# Altium footprint library CONN_HDR_MINI_ST_SMD.PcbLib: 102 footprints (part 3 of 7)
Each footprint in its own frame and in the unit in brackets; x right, y up, seen from the top. Pads: shape width x height; smd on the part's side, far side on the other; paste and mask are expansions set on the pad; w line width, h text height; cw(c..) or ccw(c..) is an arc to the next point about the centre after c.
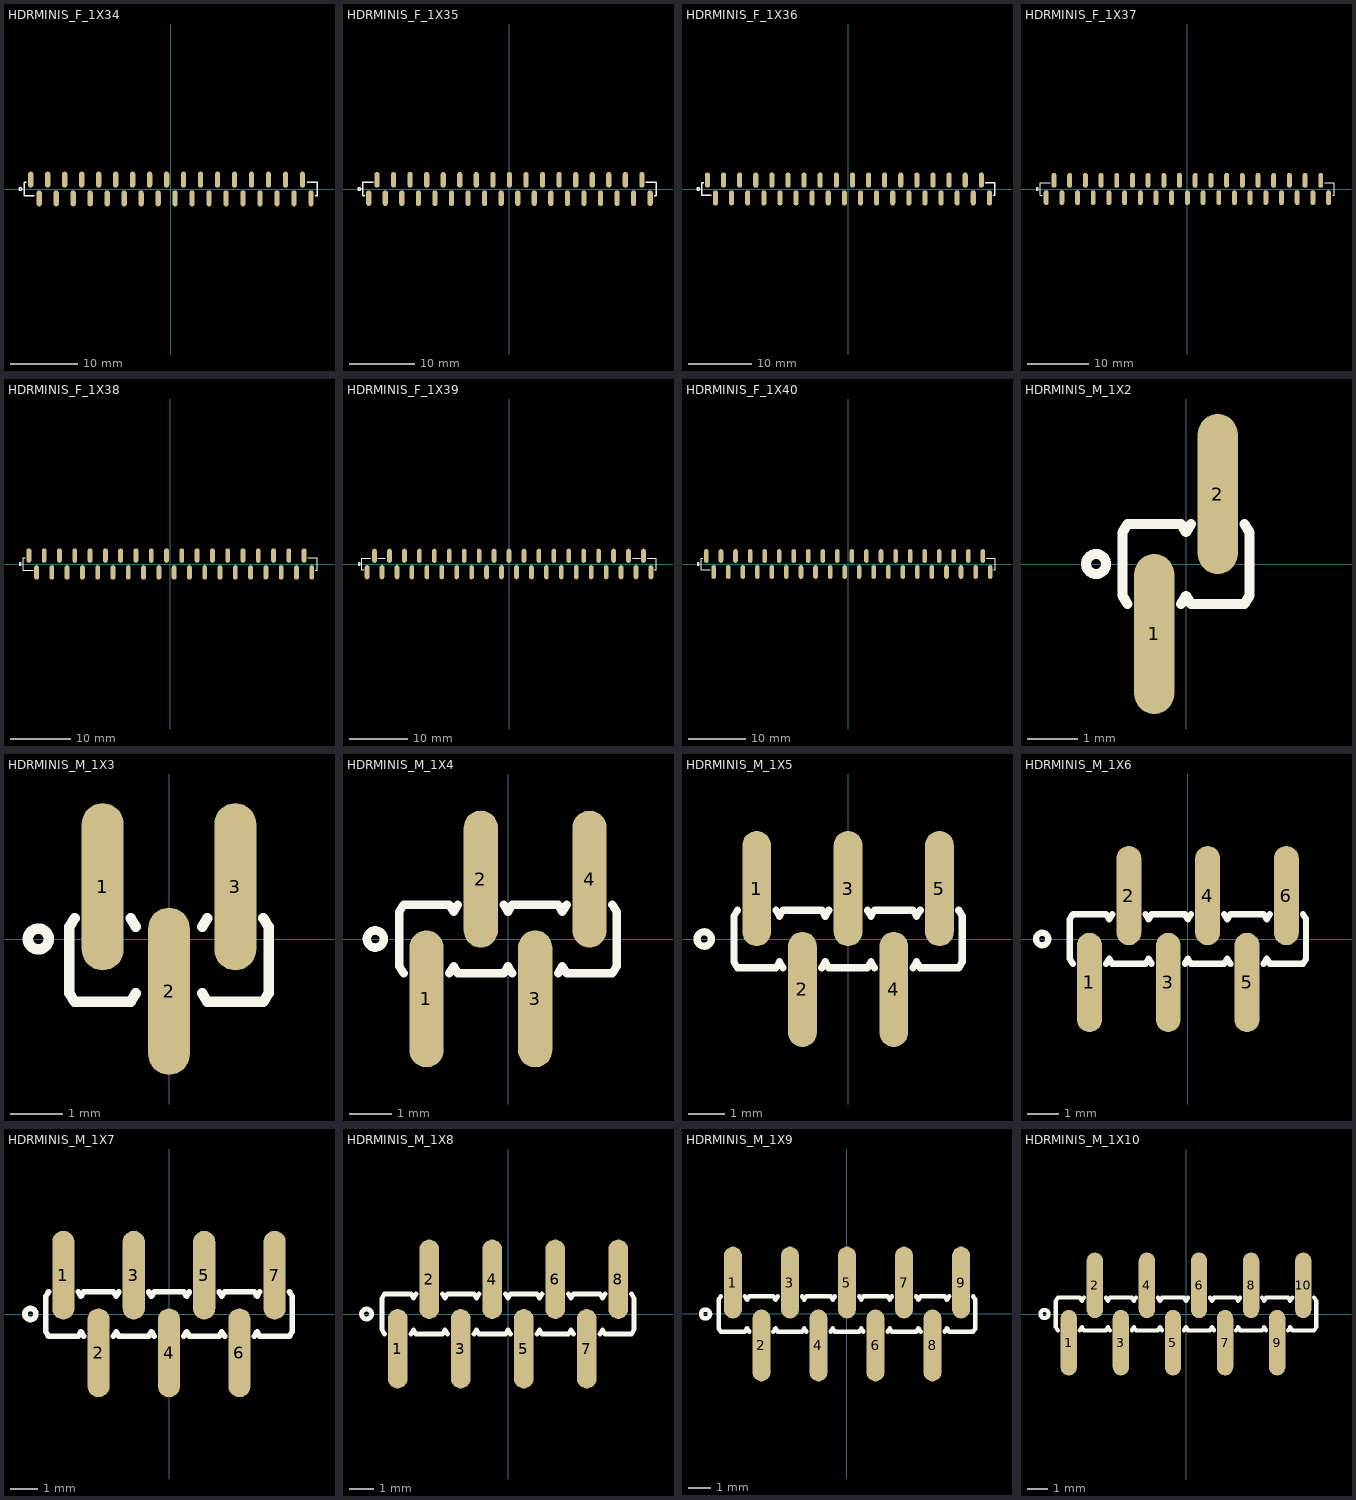
[diagram p2: the footprints below, top view; thin cyan lines are the x and y axes]

## HDRMINIS_F_1X34 [mm] "mini header (50mil pitch)"
pads (34):
  oval 0.8x2.4 smd mask+0.1: 1(-20.955,1.4) 2(-19.685,-1.4) 3(-18.415,1.4) 4(-17.145,-1.4) 5(-15.875,1.4) 6(-14.605,-1.4) 7(-13.335,1.4) 8(-12.065,-1.4) 9(-10.795,1.4) 10(-9.525,-1.4) 11(-8.255,1.4) 12(-6.985,-1.4) 13(-5.715,1.4) 14(-4.445,-1.4) 15(-3.175,1.4) 16(-1.905,-1.4) 17(-0.635,1.4) 18(0.635,-1.4) 19(1.905,1.4) 20(3.175,-1.4) 21(4.445,1.4) 22(5.715,-1.4) 23(6.985,1.4) 24(8.255,-1.4) 25(9.525,1.4) 26(10.795,-1.4) 27(12.065,1.4) 28(13.335,-1.4) 29(14.605,1.4) 30(15.875,-1.4) 31(17.145,1.4) 32(18.415,-1.4) 33(19.685,1.4) 34(20.955,-1.4)
Top Overlay:
  circle w0.2: c-22.5,0 r0.2
  lines w0.2: -21.6,1 -21.9,1 -21.9,-1 -20.4,-1 ; 20.4,1 21.9,1 21.9,-1 21.6,-1
3D body "a-bl127-eg-z02mr1.step": height 4.65, standoff 0.05, extent 3.61,-1.6 6.55,1.6
3D body "a-bl127-eg-z02mr1.step": height 4.65, standoff 0.05, extent 6.15,-1.6 9.09,1.6
3D body "a-bl127-eg-z02mr1.step": height 4.65, standoff 0.05, extent 8.69,-1.6 11.63,1.6
3D body "a-bl127-eg-z02mr1.step": height 4.65, standoff 0.05, extent 11.23,-1.6 14.17,1.6
3D body "a-bl127-eg-z02mr1.step": height 4.65, standoff 0.05, extent 13.77,-1.6 16.71,1.6
3D body "a-bl127-eg-z02mr1.step": height 4.65, standoff 0.05, extent 16.31,-1.6 19.25,1.6
3D body "a-bl127-eg-z02mr1.step": height 4.65, standoff 0.05, extent 18.85,-1.6 21.79,1.6
3D body "a-bl127-eg-z02mr1.step": height 4.65, standoff 0.05, extent -6.55,-1.6 -3.61,1.6
3D body "a-bl127-eg-z02mr1.step": height 4.65, standoff 0.05, extent -4.01,-1.6 -1.07,1.6
3D body "a-bl127-eg-z02mr1.step": height 4.65, standoff 0.05, extent -1.47,-1.6 1.47,1.6
3D body "a-bl127-eg-z02mr1.step": height 4.65, standoff 0.05, extent 1.07,-1.6 4.01,1.6
3D body "a-bl127-eg-z02mr1.step": height 4.65, standoff 0.05, extent -9.09,-1.6 -6.15,1.6
3D body "a-bl127-eg-z02mr1.step": height 4.65, standoff 0.05, extent -11.63,-1.6 -8.69,1.6
3D body "a-bl127-eg-z02mr1.step": height 4.65, standoff 0.05, extent -14.17,-1.6 -11.23,1.6
3D body "a-bl127-eg-z02mr1.step": height 4.65, standoff 0.05, extent -16.71,-1.6 -13.77,1.6
3D body "a-bl127-eg-z02mr1.step": height 4.65, standoff 0.05, extent -19.25,-1.6 -16.31,1.6
3D body "a-bl127-eg-z02mr1.step": height 4.65, standoff 0.05, extent -21.79,-1.6 -18.85,1.6

## HDRMINIS_F_1X35 [mm] "mini header (50mil pitch)"
pads (35):
  oval 0.8x2.4 smd mask+0.1: 1(-21.59,-1.4) 2(-20.32,1.4) 3(-19.05,-1.4) 4(-17.78,1.4) 5(-16.51,-1.4) 6(-15.24,1.4) 7(-13.97,-1.4) 8(-12.7,1.4) 9(-11.43,-1.4) 10(-10.16,1.4) 11(-8.89,-1.4) 12(-7.62,1.4) 13(-6.35,-1.4) 14(-5.08,1.4) 15(-3.81,-1.4) 16(-2.54,1.4) 17(-1.27,-1.4) 18(0,1.4) 19(1.27,-1.4) 20(2.54,1.4) 21(3.81,-1.4) 22(5.08,1.4) 23(6.35,-1.4) 24(7.62,1.4) 25(8.89,-1.4) 26(10.16,1.4) 27(11.43,-1.4) 28(12.7,1.4) 29(13.97,-1.4) 30(15.24,1.4) 31(16.51,-1.4) 32(17.78,1.4) 33(19.05,-1.4) 34(20.32,1.4) 35(21.59,-1.4)
Top Overlay:
  circle w0.2: c-23.033,0 r0.2
  lines w0.2: -22.2,-1 -22.5,-1 -22.5,1 -20.9,1 ; 20.9,1 22.5,1 22.5,-1 22.2,-1
3D body "a-bl127-eg-z03mr1.stp": height 4.65, standoff 0.05, extent -22.425,-1.6 -18.215,1.6
3D body "a-bl127-eg-z02mr1.step": height 4.65, standoff 0.05, extent -18.615,-1.6 -15.675,1.6
3D body "a-bl127-eg-z02mr1.step": height 4.65, standoff 0.05, extent -16.075,-1.6 -13.135,1.6
3D body "a-bl127-eg-z02mr1.step": height 4.65, standoff 0.05, extent -13.535,-1.6 -10.595,1.6
3D body "a-bl127-eg-z02mr1.step": height 4.65, standoff 0.05, extent -10.995,-1.6 -8.055,1.6
3D body "a-bl127-eg-z02mr1.step": height 4.65, standoff 0.05, extent -8.455,-1.6 -5.515,1.6
3D body "a-bl127-eg-z02mr1.step": height 4.65, standoff 0.05, extent -5.915,-1.6 -2.975,1.6
3D body "a-bl127-eg-z02mr1.step": height 4.65, standoff 0.05, extent 4.245,-1.6 7.185,1.6
3D body "a-bl127-eg-z02mr1.step": height 4.65, standoff 0.05, extent 1.705,-1.6 4.645,1.6
3D body "a-bl127-eg-z02mr1.step": height 4.65, standoff 0.05, extent -0.835,-1.6 2.105,1.6
3D body "a-bl127-eg-z02mr1.step": height 4.65, standoff 0.05, extent -3.375,-1.6 -0.435,1.6
3D body "a-bl127-eg-z02mr1.step": height 4.65, standoff 0.05, extent 19.485,-1.6 22.425,1.6
3D body "a-bl127-eg-z02mr1.step": height 4.65, standoff 0.05, extent 16.945,-1.6 19.885,1.6
3D body "a-bl127-eg-z02mr1.step": height 4.65, standoff 0.05, extent 14.405,-1.6 17.345,1.6
3D body "a-bl127-eg-z02mr1.step": height 4.65, standoff 0.05, extent 11.865,-1.6 14.805,1.6
3D body "a-bl127-eg-z02mr1.step": height 4.65, standoff 0.05, extent 9.325,-1.6 12.265,1.6
3D body "a-bl127-eg-z02mr1.step": height 4.65, standoff 0.05, extent 6.785,-1.6 9.725,1.6

## HDRMINIS_F_1X36 [mm] "mini header (50mil pitch)"
pads (36):
  oval 0.8x2.4 smd mask+0.1: 1(-22.225,1.4) 2(-20.955,-1.4) 3(-19.685,1.4) 4(-18.415,-1.4) 5(-17.145,1.4) 6(-15.875,-1.4) 7(-14.605,1.4) 8(-13.335,-1.4) 9(-12.065,1.4) 10(-10.795,-1.4) 11(-9.525,1.4) 12(-8.255,-1.4) 13(-6.985,1.4) 14(-5.715,-1.4) 15(-4.445,1.4) 16(-3.175,-1.4) 17(-1.905,1.4) 18(-0.635,-1.4) 19(0.635,1.4) 20(1.905,-1.4) 21(3.175,1.4) 22(4.445,-1.4) 23(5.715,1.4) 24(6.985,-1.4) 25(8.255,1.4) 26(9.525,-1.4) 27(10.795,1.4) 28(12.065,-1.4) 29(13.335,1.4) 30(14.605,-1.4) 31(15.875,1.4) 32(17.145,-1.4) 33(18.415,1.4) 34(19.685,-1.4) 35(20.955,1.4) 36(22.225,-1.4)
Top Overlay:
  circle w0.2: c-23.668,0 r0.2
  lines w0.2: -22.8,1 -23.1,1 -23.1,-1 -21.6,-1 ; 21.6,1 23.1,1 23.1,-1 22.8,-1
3D body "a-bl127-eg-z02mr1.step": height 4.65, standoff 0.05, extent -23.06,-1.6 -20.12,1.6
3D body "a-bl127-eg-z02mr1.step": height 4.65, standoff 0.05, extent -20.52,-1.6 -17.58,1.6
3D body "a-bl127-eg-z02mr1.step": height 4.65, standoff 0.05, extent -17.98,-1.6 -15.04,1.6
3D body "a-bl127-eg-z02mr1.step": height 4.65, standoff 0.05, extent -15.44,-1.6 -12.5,1.6
3D body "a-bl127-eg-z02mr1.step": height 4.65, standoff 0.05, extent -12.9,-1.6 -9.96,1.6
3D body "a-bl127-eg-z02mr1.step": height 4.65, standoff 0.05, extent -10.36,-1.6 -7.42,1.6
3D body "a-bl127-eg-z02mr1.step": height 4.65, standoff 0.05, extent -0.2,-1.6 2.74,1.6
3D body "a-bl127-eg-z02mr1.step": height 4.65, standoff 0.05, extent -2.74,-1.6 0.2,1.6
3D body "a-bl127-eg-z02mr1.step": height 4.65, standoff 0.05, extent -5.28,-1.6 -2.34,1.6
3D body "a-bl127-eg-z02mr1.step": height 4.65, standoff 0.05, extent -7.82,-1.6 -4.88,1.6
3D body "a-bl127-eg-z02mr1.step": height 4.65, standoff 0.05, extent 17.58,-1.6 20.52,1.6
3D body "a-bl127-eg-z02mr1.step": height 4.65, standoff 0.05, extent 20.12,-1.6 23.06,1.6
3D body "a-bl127-eg-z02mr1.step": height 4.65, standoff 0.05, extent 15.04,-1.6 17.98,1.6
3D body "a-bl127-eg-z02mr1.step": height 4.65, standoff 0.05, extent 12.5,-1.6 15.44,1.6
3D body "a-bl127-eg-z02mr1.step": height 4.65, standoff 0.05, extent 9.96,-1.6 12.9,1.6
3D body "a-bl127-eg-z02mr1.step": height 4.65, standoff 0.05, extent 7.42,-1.6 10.36,1.6
3D body "a-bl127-eg-z02mr1.step": height 4.65, standoff 0.05, extent 4.88,-1.6 7.82,1.6
3D body "a-bl127-eg-z02mr1.step": height 4.65, standoff 0.05, extent 2.34,-1.6 5.28,1.6

## HDRMINIS_F_1X37 [mm] "mini header (50mil pitch)"
pads (37):
  oval 0.8x2.4 smd mask+0.1: 1(-22.86,-1.4) 2(-21.59,1.4) 3(-20.32,-1.4) 4(-19.05,1.4) 5(-17.78,-1.4) 6(-16.51,1.4) 7(-15.24,-1.4) 8(-13.97,1.4) 9(-12.7,-1.4) 10(-11.43,1.4) 11(-10.16,-1.4) 12(-8.89,1.4) 13(-7.62,-1.4) 14(-6.35,1.4) 15(-5.08,-1.4) 16(-3.81,1.4) 17(-2.54,-1.4) 18(-1.27,1.4) 19(0,-1.4) 20(1.27,1.4) 21(2.54,-1.4) 22(3.81,1.4) 23(5.08,-1.4) 24(6.35,1.4) 25(7.62,-1.4) 26(8.89,1.4) 27(10.16,-1.4) 28(11.43,1.4) 29(12.7,-1.4) 30(13.97,1.4) 31(15.24,-1.4) 32(16.51,1.4) 33(17.78,-1.4) 34(19.05,1.4) 35(20.32,-1.4) 36(21.59,1.4) 37(22.86,-1.4)
Top Overlay:
  circle w0.2: c-24.303,0 r0.2
  lines w0.2: -23.5,-1 -23.8,-1 -23.8,1 -22.2,1 ; 22.2,1 23.8,1 23.8,-1 23.5,-1
3D body "a-bl127-eg-z02mr1.step": height 4.65, standoff 0.05, extent 5.515,-1.6 8.455,1.6
3D body "a-bl127-eg-z02mr1.step": height 4.65, standoff 0.05, extent 8.055,-1.6 10.995,1.6
3D body "a-bl127-eg-z02mr1.step": height 4.65, standoff 0.05, extent 10.595,-1.6 13.535,1.6
3D body "a-bl127-eg-z02mr1.step": height 4.65, standoff 0.05, extent 13.135,-1.6 16.075,1.6
3D body "a-bl127-eg-z02mr1.step": height 4.65, standoff 0.05, extent 15.675,-1.6 18.615,1.6
3D body "a-bl127-eg-z02mr1.step": height 4.65, standoff 0.05, extent 18.215,-1.6 21.155,1.6
3D body "a-bl127-eg-z02mr1.step": height 4.65, standoff 0.05, extent 20.755,-1.6 23.695,1.6
3D body "a-bl127-eg-z02mr1.step": height 4.65, standoff 0.05, extent -4.645,-1.6 -1.705,1.6
3D body "a-bl127-eg-z02mr1.step": height 4.65, standoff 0.05, extent -2.105,-1.6 0.835,1.6
3D body "a-bl127-eg-z02mr1.step": height 4.65, standoff 0.05, extent 0.435,-1.6 3.375,1.6
3D body "a-bl127-eg-z02mr1.step": height 4.65, standoff 0.05, extent 2.975,-1.6 5.915,1.6
3D body "a-bl127-eg-z02mr1.step": height 4.65, standoff 0.05, extent -7.185,-1.6 -4.245,1.6
3D body "a-bl127-eg-z02mr1.step": height 4.65, standoff 0.05, extent -9.725,-1.6 -6.785,1.6
3D body "a-bl127-eg-z02mr1.step": height 4.65, standoff 0.05, extent -12.265,-1.6 -9.325,1.6
3D body "a-bl127-eg-z02mr1.step": height 4.65, standoff 0.05, extent -14.805,-1.6 -11.865,1.6
3D body "a-bl127-eg-z02mr1.step": height 4.65, standoff 0.05, extent -17.345,-1.6 -14.405,1.6
3D body "a-bl127-eg-z02mr1.step": height 4.65, standoff 0.05, extent -19.885,-1.6 -16.945,1.6
3D body "a-bl127-eg-z03mr1.stp": height 4.65, standoff 0.05, extent -23.695,-1.6 -19.485,1.6

## HDRMINIS_F_1X38 [mm] "mini header (50mil pitch)"
pads (38):
  oval 0.8x2.4 smd mask+0.1: 1(-23.495,1.4) 2(-22.225,-1.4) 3(-20.955,1.4) 4(-19.685,-1.4) 5(-18.415,1.4) 6(-17.145,-1.4) 7(-15.875,1.4) 8(-14.605,-1.4) 9(-13.335,1.4) 10(-12.065,-1.4) 11(-10.795,1.4) 12(-9.525,-1.4) 13(-8.255,1.4) 14(-6.985,-1.4) 15(-5.715,1.4) 16(-4.445,-1.4) 17(-3.175,1.4) 18(-1.905,-1.4) 19(-0.635,1.4) 20(0.635,-1.4) 21(1.905,1.4) 22(3.175,-1.4) 23(4.445,1.4) 24(5.715,-1.4) 25(6.985,1.4) 26(8.255,-1.4) 27(9.525,1.4) 28(10.795,-1.4) 29(12.065,1.4) 30(13.335,-1.4) 31(14.605,1.4) 32(15.875,-1.4) 33(17.145,1.4) 34(18.415,-1.4) 35(19.685,1.4) 36(20.955,-1.4) 37(22.225,1.4) 38(23.495,-1.4)
Top Overlay:
  circle w0.2: c-24.938,0 r0.2
  lines w0.2: -24.1,1 -24.4,1 -24.4,-1 -22.8,-1 ; 22.8,1 24.4,1 24.4,-1 24.1,-1
3D body "a-bl127-eg-z02mr1.step": height 4.65, standoff 0.05, extent -24.33,-1.6 -21.39,1.6
3D body "a-bl127-eg-z02mr1.step": height 4.65, standoff 0.05, extent -21.79,-1.6 -18.85,1.6
3D body "a-bl127-eg-z02mr1.step": height 4.65, standoff 0.05, extent -19.25,-1.6 -16.31,1.6
3D body "a-bl127-eg-z02mr1.step": height 4.65, standoff 0.05, extent -16.71,-1.6 -13.77,1.6
3D body "a-bl127-eg-z02mr1.step": height 4.65, standoff 0.05, extent -14.17,-1.6 -11.23,1.6
3D body "a-bl127-eg-z02mr1.step": height 4.65, standoff 0.05, extent -11.63,-1.6 -8.69,1.6
3D body "a-bl127-eg-z02mr1.step": height 4.65, standoff 0.05, extent -1.47,-1.6 1.47,1.6
3D body "a-bl127-eg-z02mr1.step": height 4.65, standoff 0.05, extent -4.01,-1.6 -1.07,1.6
3D body "a-bl127-eg-z02mr1.step": height 4.65, standoff 0.05, extent -6.55,-1.6 -3.61,1.6
3D body "a-bl127-eg-z02mr1.step": height 4.65, standoff 0.05, extent -9.09,-1.6 -6.15,1.6
3D body "a-bl127-eg-z02mr1.step": height 4.65, standoff 0.05, extent 16.31,-1.6 19.25,1.6
3D body "a-bl127-eg-z02mr1.step": height 4.65, standoff 0.05, extent 18.85,-1.6 21.79,1.6
3D body "a-bl127-eg-z02mr1.step": height 4.65, standoff 0.05, extent 21.39,-1.6 24.33,1.6
3D body "a-bl127-eg-z02mr1.step": height 4.65, standoff 0.05, extent 13.77,-1.6 16.71,1.6
3D body "a-bl127-eg-z02mr1.step": height 4.65, standoff 0.05, extent 11.23,-1.6 14.17,1.6
3D body "a-bl127-eg-z02mr1.step": height 4.65, standoff 0.05, extent 8.69,-1.6 11.63,1.6
3D body "a-bl127-eg-z02mr1.step": height 4.65, standoff 0.05, extent 6.15,-1.6 9.09,1.6
3D body "a-bl127-eg-z02mr1.step": height 4.65, standoff 0.05, extent 3.61,-1.6 6.55,1.6
3D body "a-bl127-eg-z02mr1.step": height 4.65, standoff 0.05, extent 1.07,-1.6 4.01,1.6

## HDRMINIS_F_1X39 [mm] "mini header (50mil pitch)"
pads (39):
  oval 0.8x2.4 smd mask+0.1: 1(-24.13,-1.4) 2(-22.86,1.4) 3(-21.59,-1.4) 4(-20.32,1.4) 5(-19.05,-1.4) 6(-17.78,1.4) 7(-16.51,-1.4) 8(-15.24,1.4) 9(-13.97,-1.4) 10(-12.7,1.4) 11(-11.43,-1.4) 12(-10.16,1.4) 13(-8.89,-1.4) 14(-7.62,1.4) 15(-6.35,-1.4) 16(-5.08,1.4) 17(-3.81,-1.4) 18(-2.54,1.4) 19(-1.27,-1.4) 20(0,1.4) 21(1.27,-1.4) 22(2.54,1.4) 23(3.81,-1.4) 24(5.08,1.4) 25(6.35,-1.4) 26(7.62,1.4) 27(8.89,-1.4) 28(10.16,1.4) 29(11.43,-1.4) 30(12.7,1.4) 31(13.97,-1.4) 32(15.24,1.4) 33(16.51,-1.4) 34(17.78,1.4) 35(19.05,-1.4) 36(20.32,1.4) 37(21.59,-1.4) 38(22.86,1.4) 39(24.13,-1.4)
Top Overlay:
  circle w0.2: c-25.473,0 r0.2
  lines w0.2: -24.7,-1 -25,-1 -25,1 -23.5,1 ; -22.3,1 -21,1 ; 21,1 22.3,1 ; 23.5,1 25,1 25,-1 24.7,-1
3D body "a-bl127-eg-z02mr1.step": height 4.65, standoff 0.05, extent 4.245,-1.6 7.185,1.6
3D body "a-bl127-eg-z02mr1.step": height 4.65, standoff 0.05, extent 6.785,-1.6 9.725,1.6
3D body "a-bl127-eg-z02mr1.step": height 4.65, standoff 0.05, extent 9.325,-1.6 12.265,1.6
3D body "a-bl127-eg-z02mr1.step": height 4.65, standoff 0.05, extent 11.865,-1.6 14.805,1.6
3D body "a-bl127-eg-z02mr1.step": height 4.65, standoff 0.05, extent 14.405,-1.6 17.345,1.6
3D body "a-bl127-eg-z02mr1.step": height 4.65, standoff 0.05, extent 16.945,-1.6 19.885,1.6
3D body "a-bl127-eg-z02mr1.step": height 4.65, standoff 0.05, extent 22.025,-1.6 24.965,1.6
3D body "a-bl127-eg-z02mr1.step": height 4.65, standoff 0.05, extent 19.485,-1.6 22.425,1.6
3D body "a-bl127-eg-z02mr1.step": height 4.65, standoff 0.05, extent -5.915,-1.6 -2.975,1.6
3D body "a-bl127-eg-z02mr1.step": height 4.65, standoff 0.05, extent -3.375,-1.6 -0.435,1.6
3D body "a-bl127-eg-z02mr1.step": height 4.65, standoff 0.05, extent -0.835,-1.6 2.105,1.6
3D body "a-bl127-eg-z02mr1.step": height 4.65, standoff 0.05, extent 1.705,-1.6 4.645,1.6
3D body "a-bl127-eg-z02mr1.step": height 4.65, standoff 0.05, extent -8.455,-1.6 -5.515,1.6
3D body "a-bl127-eg-z02mr1.step": height 4.65, standoff 0.05, extent -10.995,-1.6 -8.055,1.6
3D body "a-bl127-eg-z02mr1.step": height 4.65, standoff 0.05, extent -13.535,-1.6 -10.595,1.6
3D body "a-bl127-eg-z02mr1.step": height 4.65, standoff 0.05, extent -16.075,-1.6 -13.135,1.6
3D body "a-bl127-eg-z02mr1.step": height 4.65, standoff 0.05, extent -18.615,-1.6 -15.675,1.6
3D body "a-bl127-eg-z02mr1.step": height 4.65, standoff 0.05, extent -21.155,-1.6 -18.215,1.6
3D body "a-bl127-eg-z03mr1.stp": height 4.65, standoff 0.05, extent -24.965,-1.6 -20.755,1.6

## HDRMINIS_F_1X40 [mm] "mini header (50mil pitch)"
pads (40):
  oval 0.8x2.4 smd mask+0.1: 1(-24.765,1.4) 2(-23.495,-1.4) 3(-22.225,1.4) 4(-20.955,-1.4) 5(-19.685,1.4) 6(-18.415,-1.4) 7(-17.145,1.4) 8(-15.875,-1.4) 9(-14.605,1.4) 10(-13.335,-1.4) 11(-12.065,1.4) 12(-10.795,-1.4) 13(-9.525,1.4) 14(-8.255,-1.4) 15(-6.985,1.4) 16(-5.715,-1.4) 17(-4.445,1.4) 18(-3.175,-1.4) 19(-1.905,1.4) 20(-0.635,-1.4) 21(0.635,1.4) 22(1.905,-1.4) 23(3.175,1.4) 24(4.445,-1.4) 25(5.715,1.4) 26(6.985,-1.4) 27(8.255,1.4) 28(9.525,-1.4) 29(10.795,1.4) 30(12.065,-1.4) 31(13.335,1.4) 32(14.605,-1.4) 33(15.875,1.4) 34(17.145,-1.4) 35(18.415,1.4) 36(19.685,-1.4) 37(20.955,1.4) 38(22.225,-1.4) 39(23.495,1.4) 40(24.765,-1.4)
Top Overlay:
  circle w0.2: c-26.208,0 r0.2
  lines w0.2: -25.4,1 -25.7,1 -25.7,-1 -24.1,-1 ; 24.1,1 25.7,1 25.7,-1 25.4,-1
3D body "a-bl127-eg-z02mr1.step": height 4.65, standoff 0.05, extent -0.2,-1.6 2.74,1.6
3D body "a-bl127-eg-z02mr1.step": height 4.65, standoff 0.05, extent 2.34,-1.6 5.28,1.6
3D body "a-bl127-eg-z02mr1.step": height 4.65, standoff 0.05, extent 4.88,-1.6 7.82,1.6
3D body "a-bl127-eg-z02mr1.step": height 4.65, standoff 0.05, extent 7.42,-1.6 10.36,1.6
3D body "a-bl127-eg-z02mr1.step": height 4.65, standoff 0.05, extent 9.96,-1.6 12.9,1.6
3D body "a-bl127-eg-z02mr1.step": height 4.65, standoff 0.05, extent 12.5,-1.6 15.44,1.6
3D body "a-bl127-eg-z02mr1.step": height 4.65, standoff 0.05, extent 22.66,-1.6 25.6,1.6
3D body "a-bl127-eg-z02mr1.step": height 4.65, standoff 0.05, extent 20.12,-1.6 23.06,1.6
3D body "a-bl127-eg-z02mr1.step": height 4.65, standoff 0.05, extent 17.58,-1.6 20.52,1.6
3D body "a-bl127-eg-z02mr1.step": height 4.65, standoff 0.05, extent 15.04,-1.6 17.98,1.6
3D body "a-bl127-eg-z02mr1.step": height 4.65, standoff 0.05, extent -10.36,-1.6 -7.42,1.6
3D body "a-bl127-eg-z02mr1.step": height 4.65, standoff 0.05, extent -7.82,-1.6 -4.88,1.6
3D body "a-bl127-eg-z02mr1.step": height 4.65, standoff 0.05, extent -5.28,-1.6 -2.34,1.6
3D body "a-bl127-eg-z02mr1.step": height 4.65, standoff 0.05, extent -2.74,-1.6 0.2,1.6
3D body "a-bl127-eg-z02mr1.step": height 4.65, standoff 0.05, extent -12.9,-1.6 -9.96,1.6
3D body "a-bl127-eg-z02mr1.step": height 4.65, standoff 0.05, extent -15.44,-1.6 -12.5,1.6
3D body "a-bl127-eg-z02mr1.step": height 4.65, standoff 0.05, extent -17.98,-1.6 -15.04,1.6
3D body "a-bl127-eg-z02mr1.step": height 4.65, standoff 0.05, extent -20.52,-1.6 -17.58,1.6
3D body "a-bl127-eg-z02mr1.step": height 4.65, standoff 0.05, extent -23.06,-1.6 -20.12,1.6
3D body "a-bl127-eg-z02mr1.step": height 4.65, standoff 0.05, extent -25.6,-1.6 -22.66,1.6

## HDRMINIS_M_1X2 [mm] "mini header (50mil pitch)"
pads (2):
  oval 0.8x3.2 smd mask+0.1: 1(-0.635,-1.4) 2(0.635,1.4)
Top Overlay:
  circle w0.2: c-1.8,0 r0.2
  lines w0.2: -1.171,-0.8 -1.27,-0.635 -1.27,0.635 -1.171,0.8 -0.099,0.8 0,0.635 0.099,0.8 ; -0.099,-0.8 0,-0.635 0.099,-0.8 1.171,-0.8 1.27,-0.635 1.27,0.635 1.171,0.8
3D body "BD021-02A-A1-0350-0200-0550-LB.stp": height 5.5, standoff 0, extent -1.27,-2.75 1.27,2.75

## HDRMINIS_M_1X3 [mm] "mini header (50mil pitch)"
pads (3):
  oval 0.8x3.2 smd mask+0.1: 1(-1.27,1) 2(0,-1) 3(1.27,1)
Top Overlay:
  circle w0.2: c-2.5,0 r0.2
  lines w0.2: -1.806,0.4 -1.905,0.235 -1.905,-1.035 -1.806,-1.2 -0.734,-1.2 -0.635,-1.035 ; -0.734,0.4 -0.635,0.235 ; 0.635,-1.035 0.734,-1.2 1.806,-1.2 1.905,-1.035 1.905,0.235 1.806,0.4 ; 0.635,0.235 0.734,0.4
3D body "BD021-03A-A1-0350-0200-0550-LB.stp": height 5.5, standoff 0, extent -1.91,-2.75 1.9,2.75

## HDRMINIS_M_1X4 [mm] "mini header (50mil pitch)"
pads (4):
  oval 0.8x3.2 smd mask+0.1: 1(-1.905,-1.4) 2(-0.635,1.4) 3(0.635,-1.4) 4(1.905,1.4)
Top Overlay:
  circle w0.2: c-3.1,0 r0.2
  lines w0.2: -2.441,-0.8 -2.54,-0.635 -2.54,0.635 -2.441,0.8 -1.369,0.8 -1.27,0.635 -1.171,0.8 ; -1.369,-0.8 -1.27,-0.635 -1.171,-0.8 -0.099,-0.8 0,-0.635 0.099,-0.8 ; -0.099,0.8 0,0.635 0.099,0.8 1.171,0.8 1.27,0.635 1.369,0.8 ; 1.171,-0.8 1.27,-0.635 1.369,-0.8 2.441,-0.8 2.54,-0.635 2.54,0.635 2.441,0.8
3D body "BD021-02A-A1-0350-0200-0550-LB.stp": height 5.5, standoff 0, extent -2.54,-2.75 0,2.75
3D body "BD021-02A-A1-0350-0200-0550-LB.stp": height 5.5, standoff 0, extent 0,-2.75 2.54,2.75

## HDRMINIS_M_1X5 [mm] "mini header (50mil pitch)"
pads (5):
  oval 0.8x3.2 smd mask+0.1: 1(-2.54,1.4) 2(-1.27,-1.4) 3(0,1.4) 4(1.27,-1.4) 5(2.54,1.4)
Top Overlay:
  circle w0.2: c-4,0 r0.2
  lines w0.2: -3.076,0.8 -3.175,0.635 -3.175,-0.635 -3.076,-0.8 -2.004,-0.8 -1.905,-0.635 -1.806,-0.8 ; -2.004,0.8 -1.905,0.635 -1.806,0.8 -0.734,0.8 -0.635,0.635 -0.536,0.8 ; -0.734,-0.8 -0.635,-0.635 -0.536,-0.8 0.536,-0.8 0.635,-0.635 0.734,-0.8 ; 0.536,0.8 0.635,0.635 0.734,0.8 1.806,0.8 1.905,0.635 2.004,0.8 ; 1.806,-0.8 1.905,-0.635 2.004,-0.8 3.076,-0.8 3.175,-0.635 3.175,0.635 3.076,0.8
3D body "BD021-03A-A1-0350-0200-0550-LB.stp": height 5.5, standoff 0, extent -3.18,-2.75 0.63,2.75
3D body "BD021-02A-A1-0350-0200-0550-LB.stp": height 5.5, standoff 0, extent 0.635,-2.75 3.175,2.75

## HDRMINIS_M_1X6 [mm] "mini header (50mil pitch)"
pads (6):
  oval 0.8x3.2 smd mask+0.1: 1(-3.175,-1.4) 2(-1.905,1.4) 3(-0.635,-1.4) 4(0.635,1.4) 5(1.905,-1.4) 6(3.175,1.4)
Top Overlay:
  circle w0.2: c-4.7,0 r0.2
  lines w0.2: -3.711,-0.8 -3.81,-0.635 -3.81,0.635 -3.711,0.8 -2.639,0.8 -2.54,0.635 -2.441,0.8 ; -2.639,-0.8 -2.54,-0.635 -2.441,-0.8 -1.369,-0.8 -1.27,-0.635 -1.171,-0.8 ; -1.369,0.8 -1.27,0.635 -1.171,0.8 -0.099,0.8 0,0.635 0.099,0.8 ; -0.099,-0.8 0,-0.635 0.099,-0.8 1.171,-0.8 1.27,-0.635 1.369,-0.8 ; 1.171,0.8 1.27,0.635 1.369,0.8 2.441,0.8 2.54,0.635 2.639,0.8 ; 2.441,-0.8 2.54,-0.635 2.639,-0.8 3.711,-0.8 3.81,-0.635 3.81,0.635 3.711,0.8
3D body "BD021-02A-A1-0350-0200-0550-LB.stp": height 5.5, standoff 0, extent 1.27,-2.75 3.81,2.75
3D body "BD021-02A-A1-0350-0200-0550-LB.stp": height 5.5, standoff 0, extent -1.27,-2.75 1.27,2.75
3D body "BD021-02A-A1-0350-0200-0550-LB.stp": height 5.5, standoff 0, extent -3.81,-2.75 -1.27,2.75

## HDRMINIS_M_1X7 [mm] "mini header (50mil pitch)"
pads (7):
  oval 0.8x3.2 smd mask+0.1: 1(-3.81,1.4) 2(-2.54,-1.4) 3(-1.27,1.4) 4(0,-1.4) 5(1.27,1.4) 6(2.54,-1.4) 7(3.81,1.4)
Top Overlay:
  circle w0.2: c-5,0 r0.2
  lines w0.2: -4.346,0.8 -4.445,0.635 -4.445,-0.635 -4.346,-0.8 -3.274,-0.8 -3.175,-0.635 -3.076,-0.8 ; -3.274,0.8 -3.175,0.635 -3.076,0.8 -2.004,0.8 -1.905,0.635 -1.806,0.8 ; -2.004,-0.8 -1.905,-0.635 -1.806,-0.8 -0.734,-0.8 -0.635,-0.635 -0.536,-0.8 ; -0.734,0.8 -0.635,0.635 -0.536,0.8 0.536,0.8 0.635,0.635 0.734,0.8 ; 0.536,-0.8 0.635,-0.635 0.734,-0.8 1.806,-0.8 1.905,-0.635 2.004,-0.8 ; 1.806,0.8 1.905,0.635 2.004,0.8 3.076,0.8 3.175,0.635 3.274,0.8 ; 3.076,-0.8 3.175,-0.635 3.274,-0.8 4.346,-0.8 4.445,-0.635 4.445,0.635 4.346,0.8
3D body "BD021-03A-A1-0350-0200-0550-LB.stp": height 5.5, standoff 0, extent -4.45,-2.75 -0.64,2.75
3D body "BD021-02A-A1-0350-0200-0550-LB.stp": height 5.5, standoff 0, extent -0.635,-2.75 1.905,2.75
3D body "BD021-02A-A1-0350-0200-0550-LB.stp": height 5.5, standoff 0, extent 1.905,-2.75 4.445,2.75

## HDRMINIS_M_1X8 [mm] "mini header (50mil pitch)"
pads (8):
  oval 0.8x3.2 smd mask+0.1: 1(-4.445,-1.4) 2(-3.175,1.4) 3(-1.905,-1.4) 4(-0.635,1.4) 5(0.635,-1.4) 6(1.905,1.4) 7(3.175,-1.4) 8(4.445,1.4)
Top Overlay:
  circle w0.2: c-5.7,0 r0.2
  lines w0.2: -4.981,-0.8 -5.08,-0.635 -5.08,0.635 -4.981,0.8 -3.909,0.8 -3.81,0.635 -3.711,0.8 ; -3.909,-0.8 -3.81,-0.635 -3.711,-0.8 -2.639,-0.8 -2.54,-0.635 -2.441,-0.8 ; -2.639,0.8 -2.54,0.635 -2.441,0.8 -1.369,0.8 -1.27,0.635 -1.171,0.8 ; -1.369,-0.8 -1.27,-0.635 -1.171,-0.8 -0.099,-0.8 0,-0.635 0.099,-0.8 ; -0.099,0.8 0,0.635 0.099,0.8 1.171,0.8 1.27,0.635 1.369,0.8 ; 1.171,-0.8 1.27,-0.635 1.369,-0.8 2.441,-0.8 2.54,-0.635 2.639,-0.8 ; 2.441,0.8 2.54,0.635 2.639,0.8 3.711,0.8 3.81,0.635 3.909,0.8 ; 3.711,-0.8 3.81,-0.635 3.909,-0.8 4.981,-0.8 5.08,-0.635 5.08,0.635 4.981,0.8
3D body "BD021-02A-A1-0350-0200-0550-LB.stp": height 5.5, standoff 0, extent 2.54,-2.75 5.08,2.75
3D body "BD021-02A-A1-0350-0200-0550-LB.stp": height 5.5, standoff 0, extent 0,-2.75 2.54,2.75
3D body "BD021-02A-A1-0350-0200-0550-LB.stp": height 5.5, standoff 0, extent -2.54,-2.75 0,2.75
3D body "BD021-02A-A1-0350-0200-0550-LB.stp": height 5.5, standoff 0, extent -5.08,-2.75 -2.54,2.75

## HDRMINIS_M_1X9 [mm] "mini header (50mil pitch)"
pads (9):
  oval 0.8x3.2 smd mask+0.1: 1(-5.08,1.4) 2(-3.81,-1.4) 3(-2.54,1.4) 4(-1.27,-1.4) 5(0,1.4) 6(1.27,-1.4) 7(2.54,1.4) 8(3.81,-1.4) 9(5.08,1.4)
Top Overlay:
  circle w0.2: c-6.3,0 r0.2
  lines w0.2: -5.616,0.8 -5.715,0.635 -5.715,-0.635 -5.616,-0.8 -4.544,-0.8 -4.445,-0.635 -4.346,-0.8 ; -4.544,0.8 -4.445,0.635 -4.346,0.8 -3.274,0.8 -3.175,0.635 -3.076,0.8 ; -3.274,-0.8 -3.175,-0.635 -3.076,-0.8 -2.004,-0.8 -1.905,-0.635 -1.806,-0.8 ; -2.004,0.8 -1.905,0.635 -1.806,0.8 -0.734,0.8 -0.635,0.635 -0.536,0.8 ; -0.734,-0.8 -0.635,-0.635 -0.536,-0.8 0.536,-0.8 0.635,-0.635 0.734,-0.8 ; 0.536,0.8 0.635,0.635 0.734,0.8 1.806,0.8 1.905,0.635 2.004,0.8 ; 1.806,-0.8 1.905,-0.635 2.004,-0.8 3.076,-0.8 3.175,-0.635 3.274,-0.8 ; 3.076,0.8 3.175,0.635 3.274,0.8 4.346,0.8 4.445,0.635 4.544,0.8 ; 4.346,-0.8 4.445,-0.635 4.544,-0.8 5.616,-0.8 5.715,-0.635 5.715,0.635 5.616,0.8
3D body "BD021-02A-A1-0350-0200-0550-LB.stp": height 5.5, standoff 0, extent 3.175,-2.75 5.715,2.75
3D body "BD021-02A-A1-0350-0200-0550-LB.stp": height 5.5, standoff 0, extent 0.635,-2.75 3.175,2.75
3D body "BD021-02A-A1-0350-0200-0550-LB.stp": height 5.5, standoff 0, extent -1.905,-2.75 0.635,2.75
3D body "BD021-03A-A1-0350-0200-0550-LB.stp": height 5.5, standoff 0, extent -5.72,-2.75 -1.91,2.75

## HDRMINIS_M_1X10 [mm] "mini header (50mil pitch)"
pads (10):
  oval 0.8x3.2 smd mask+0.1: 1(-5.715,-1.4) 2(-4.445,1.4) 3(-3.175,-1.4) 4(-1.905,1.4) 5(-0.635,-1.4) 6(0.635,1.4) 7(1.905,-1.4) 8(3.175,1.4) 9(4.445,-1.4) 10(5.715,1.4)
Top Overlay:
  circle w0.2: c-6.9,0 r0.2
  lines w0.2: -6.251,-0.8 -6.35,-0.635 -6.35,0.635 -6.251,0.8 -5.179,0.8 -5.08,0.635 -4.981,0.8 ; -5.179,-0.8 -5.08,-0.635 -4.981,-0.8 -3.909,-0.8 -3.81,-0.635 -3.711,-0.8 ; -3.909,0.8 -3.81,0.635 -3.711,0.8 -2.639,0.8 -2.54,0.635 -2.441,0.8 ; -2.639,-0.8 -2.54,-0.635 -2.441,-0.8 -1.369,-0.8 -1.27,-0.635 -1.171,-0.8 ; -1.369,0.8 -1.27,0.635 -1.171,0.8 -0.099,0.8 0,0.635 0.099,0.8 ; -0.099,-0.8 0,-0.635 0.099,-0.8 1.171,-0.8 1.27,-0.635 1.369,-0.8 ; 1.171,0.8 1.27,0.635 1.369,0.8 2.441,0.8 2.54,0.635 2.639,0.8 ; 2.441,-0.8 2.54,-0.635 2.639,-0.8 3.711,-0.8 3.81,-0.635 3.909,-0.8 ; 3.711,0.8 3.81,0.635 3.909,0.8 4.981,0.8 5.08,0.635 5.179,0.8 ; 4.981,-0.8 5.08,-0.635 5.179,-0.8 6.251,-0.8 6.35,-0.635 6.35,0.635 6.251,0.8
3D body "BD021-02A-A1-0350-0200-0550-LB.stp": height 5.5, standoff 0, extent -6.35,-2.75 -3.81,2.75
3D body "BD021-02A-A1-0350-0200-0550-LB.stp": height 5.5, standoff 0, extent -3.81,-2.75 -1.27,2.75
3D body "BD021-02A-A1-0350-0200-0550-LB.stp": height 5.5, standoff 0, extent -1.27,-2.75 1.27,2.75
3D body "BD021-02A-A1-0350-0200-0550-LB.stp": height 5.5, standoff 0, extent 1.27,-2.75 3.81,2.75
3D body "BD021-02A-A1-0350-0200-0550-LB.stp": height 5.5, standoff 0, extent 3.81,-2.75 6.35,2.75